# Altium footprint library Библиотека посадочных мест.PcbLib: 128 footprints (part 7 of 8)
Each footprint in its own frame and in the unit in brackets; x right, y up, seen from the top. Pads: shape width x height; smd on the part's side, far side on the other; paste and mask are expansions set on the pad; w line width, h text height; cw(c..) or ccw(c..) is an arc to the next point about the centre after c.
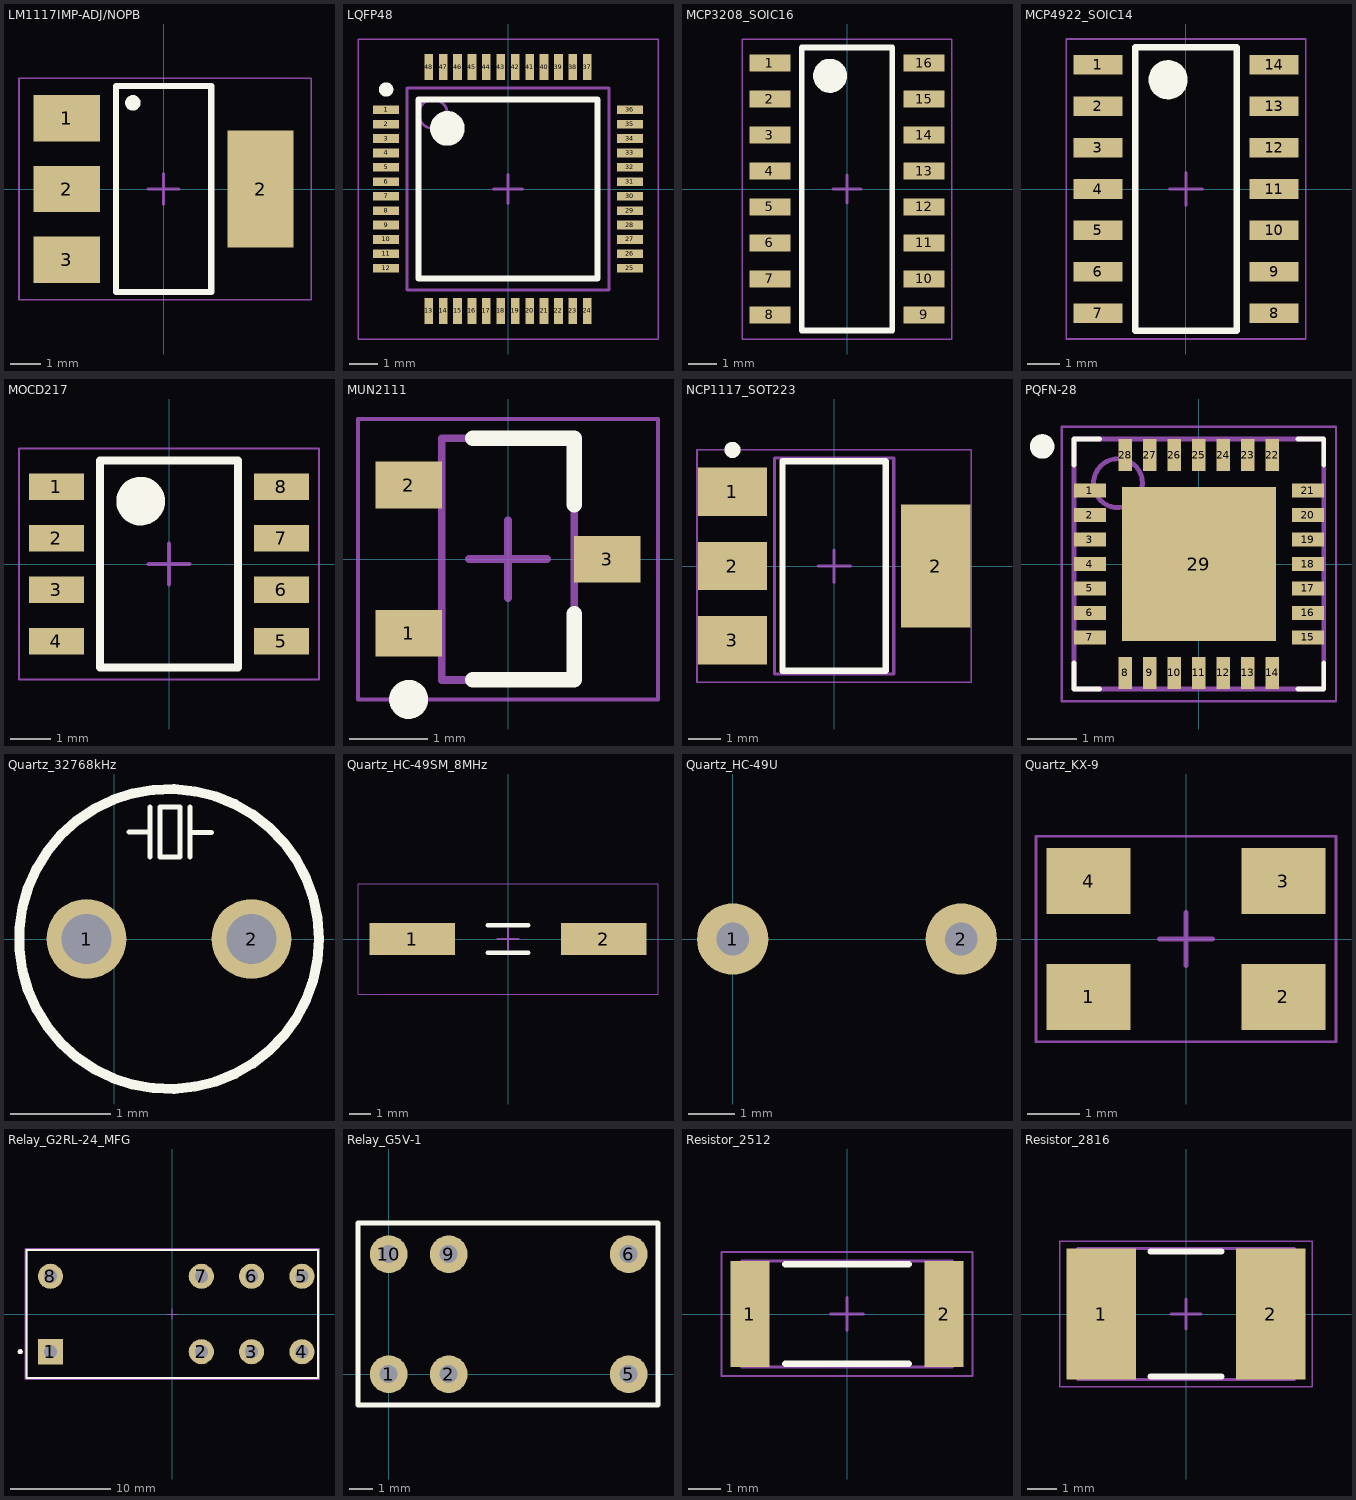
[diagram p6: the footprints below, top view; thin cyan lines are the x and y axes]

## LM1117IMP-ADJ/NOPB [mm]
height 1.8
pads (4):
  rect 2.15x1.5 smd: 1(-3.15,2.3) 2(-3.15,0) 3(-3.15,-2.3)
  rect 2.15x3.8 smd: 2(3.15,0)
Top Overlay:
  circle w0.25: c-1,2.8 r0.125
  lines w0.2: -1.55,-3.35 -1.55,3.35 1.55,3.35 1.55,-3.35 -1.55,-3.35
Mechanical 15:
  lines w0.05: -4.7,-3.6 -4.7,3.6 4.8,3.6 4.8,-3.6 -4.7,-3.6
  lines w0.1: -0.5,0 0.5,0 ; 0,-0.5 0,0.5

## LQFP48 [mm] "STM32F103C8T6"
height 1.6
pads (48):
  rect 0.9x0.3 smd: 1(-4.225,2.75) 2(-4.225,2.25) 3(-4.225,1.75) 4(-4.225,1.25) 5(-4.225,0.75) 6(-4.225,0.25) 7(-4.225,-0.25) 8(-4.225,-0.75) 9(-4.225,-1.25) 10(-4.225,-1.75) 11(-4.225,-2.25) 12(-4.225,-2.75) 25(4.225,-2.75) 26(4.225,-2.25) 27(4.225,-1.75) 28(4.225,-1.25) 29(4.225,-0.75) 30(4.225,-0.25) 31(4.225,0.25) 32(4.225,0.75) 33(4.225,1.25) 34(4.225,1.75) 35(4.225,2.25) 36(4.225,2.75)
  rect 0.3x0.9 smd: 13(-2.75,-4.225) 14(-2.25,-4.225) 15(-1.75,-4.225) 16(-1.25,-4.225) 17(-0.75,-4.225) 18(-0.25,-4.225) 19(0.25,-4.225) 20(0.75,-4.225) 21(1.25,-4.225) 22(1.75,-4.225) 23(2.25,-4.225) 24(2.75,-4.225) 37(2.75,4.225) 38(2.25,4.225) 39(1.75,4.225) 40(1.25,4.225) 41(0.75,4.225) 42(0.25,4.225) 43(-0.25,4.225) 44(-0.75,4.225) 45(-1.25,4.225) 46(-1.75,4.225) 47(-2.25,4.225) 48(-2.75,4.225)
Top Overlay:
  circle w0.6: c-2.1,2.1 r0.3
  circle w0.25: c-4.225,3.45 r0.125
  lines w0.2: -3.1,-3.1 3.1,-3.1 3.1,3.1 -3.1,3.1 -3.1,-3.1
Mechanical 13:
  circle w0.1: c-2.6,2.6 r0.5
  lines w0.1: -3.5,-3.5 3.5,-3.5 3.5,3.5 -3.5,3.5 -3.5,-3.5
Mechanical 15:
  lines w0.05: -5.2,-5.2 5.2,-5.2 5.2,5.2 -5.2,5.2 -5.2,-5.2
  lines w0.1: -0.5,0 0.5,0 ; 0,-0.5 0,0.5
3D body "LQFP48.STEP": height 1.56, standoff 0, extent -4.5,-4.513 4.5,4.487

## MCP3208_SOIC16 [mm] "SOIC, 16-Leads, Body 9,91x3,90mm, Pitch 1,27mm, IPC Medium Density"
height 1.75
pads (16):
  rect 1.45x0.6 smd: 1(-2.725,4.445) 2(-2.725,3.175) 3(-2.725,1.905) 4(-2.725,0.635) 5(-2.725,-0.635) 6(-2.725,-1.905) 7(-2.725,-3.175) 8(-2.725,-4.445) 9(2.725,-4.445) 10(2.725,-3.175) 11(2.725,-1.905) 12(2.725,-0.635) 13(2.725,0.635) 14(2.725,1.905) 15(2.725,3.175) 16(2.725,4.445)
Top Overlay:
  circle w0.6: c-0.6,4 r0.3
  lines w0.2: -1.6,-5 1.6,-5 1.6,5 -1.6,5 -1.6,-5
Mechanical 15:
  lines w0.05: -3.7,-5.3 3.7,-5.3 3.7,5.3 -3.7,5.3 -3.7,-5.3
  lines w0.1: -0.5,0 0.5,0 ; 0,-0.5 0,0.5
3D body "SOIC-16.STEP": height 1.7, standoff 0, extent -3,-5.08 3,5.08

## MCP4922_SOIC14 [mm]
height 1.75
pads (14):
  rect 1.5x0.6 smd: 1(-2.7,3.81) 2(-2.7,2.54) 3(-2.7,1.27) 4(-2.7,0) 5(-2.7,-1.27) 6(-2.7,-2.54) 7(-2.7,-3.81) 8(2.7,-3.81) 9(2.7,-2.54) 10(2.7,-1.27) 11(2.7,0) 12(2.7,1.27) 13(2.7,2.54) 14(2.7,3.81)
Top Overlay:
  circle w0.6: c-0.55,3.35 r0.3
  lines w0.2: -1.55,-4.35 -1.55,4.35 1.55,4.35 1.55,-4.35 -1.55,-4.35
Mechanical 15:
  lines w0.05: -3.675,-4.6 -3.675,4.6 3.675,4.6 3.675,-4.6 -3.675,-4.6
  lines w0.1: -0.5,0 0.5,0 ; 0,-0.5 0,0.5
3D body "SOIC-14.STEP": height 1.7, standoff 0, extent -3,-4.445 3,4.445

## MOCD217 [mm]
height 3.63
pads (8):
  rect 1.35x0.65 smd: 1(-2.775,1.905) 2(-2.775,0.635) 3(-2.775,-0.635) 4(-2.775,-1.905) 5(2.775,-1.905) 6(2.775,-0.635) 7(2.775,0.635) 8(2.775,1.905)
Top Overlay:
  circle w0.6: c-0.7,1.55 r0.3
  lines w0.2: -1.7,-2.55 1.7,-2.55 1.7,2.55 -1.7,2.55 -1.7,-2.55
Mechanical 15:
  lines w0.05: -3.7,-2.85 3.7,-2.85 3.7,2.85 -3.7,2.85 -3.7,-2.85
  lines w0.1: -0.5,0 0.5,0 ; 0,-0.5 0,0.5
3D body "SOIC_D207M_ONS.step": height 3.66, standoff 0, extent -3.099,-2.565 3.099,2.565

## MUN2111 [mm] "SOT23"
height 1.3
pads (3):
  rect 0.85x0.6 smd: 1(-1.275,-0.95) 2(-1.275,0.95) 3(1.275,0)
Top Overlay:
  circle w0.25: c-1.275,-1.8 r0.125
  lines w0.2: -0.45,-1.55 0.85,-1.55 0.85,-0.7 ; -0.45,1.55 0.85,1.55 0.85,0.7
Mechanical 13:
  lines w0.1: -0.85,-1.55 -0.85,1.55 0.85,1.55 0.85,-1.55 -0.85,-1.55
Mechanical 15:
  lines w0.05: -1.925,-1.8 -1.925,1.8 1.925,1.8 1.925,-1.8 -1.925,-1.8
  lines w0.1: -0.5,0 0.5,0 ; 0,-0.5 0,0.5
3D body "MUN2111.step": height 1.3, standoff 0, extent -1.2,-1.55 1.2,1.55

## NCP1117_SOT223 [mm]
height 1.8
pads (4):
  rect 2.15x1.5 smd: 1(-3.15,2.3) 2(-3.15,0) 3(-3.15,-2.3)
  rect 2.15x3.8 smd: 2(3.15,0)
Top Overlay:
  circle w0.25: c-3.15,3.6 r0.125
  lines w0.2: -1.6,-3.25 1.6,-3.25 1.6,3.25 -1.6,3.25 -1.6,-3.25
Mechanical 13:
  lines w0.1: -1.85,-3.35 1.85,-3.35 1.85,3.35 -1.85,3.35 -1.85,-3.35
Mechanical 15:
  lines w0.05: -4.25,-3.6 4.25,-3.6 4.25,3.6 -4.25,3.6 -4.25,-3.6
  lines w0.1: -0.5,0 0.5,0 ; 0,-0.5 0,0.5
3D body "SOT223127P600-8N.step": height 1.8, standoff 0, extent -3.65,-3.35 3.65,3.35

## PQFN-28 [mm] "For ADE7953, pack LFCSP-WQ"
height 0.8
pads (29):
  rect 0.65x0.28 smd: 1(-2.225,1.5) 2(-2.225,1) 3(-2.225,0.5) 4(-2.225,0) 5(-2.225,-0.5) 6(-2.225,-1) 7(-2.225,-1.5) 15(2.225,-1.5) 16(2.225,-1) 17(2.225,-0.5) 18(2.225,0) 19(2.225,0.5) 20(2.225,1) 21(2.225,1.5)
  rect 0.28x0.65 smd: 8(-1.5,-2.225) 9(-1,-2.225) 10(-0.5,-2.225) 11(0,-2.225) 12(0.5,-2.225) 13(1,-2.225) 14(1.5,-2.225) 22(1.5,2.225) 23(1,2.225) 24(0.5,2.225) 25(0,2.225) 26(-0.5,2.225) 27(-1,2.225) 28(-1.5,2.225)
  rect 3.14x3.14 smd: 29(0,0)
Top Overlay:
  circle w0.25: c-3.2,2.4 r0.125
  lines w0.1: -2.55,-2.025 -2.55,-2.55 -2.025,-2.55 ; -2.55,2.025 -2.55,2.55 -2.025,2.55 ; 2.025,-2.55 2.55,-2.55 2.55,-2.025 ; 2.025,2.55 2.55,2.55 2.55,2.025
Mechanical 13:
  circle w0.1: c-1.65,1.65 r0.5
  lines w0.1: -2.55,-2.55 2.55,-2.55 2.55,2.55 -2.55,2.55 -2.55,-2.55
Mechanical 15:
  lines w0.05: -2.8,-2.8 2.8,-2.8 2.8,2.8 -2.8,2.8 -2.8,-2.8
  lines w0.1: -0.5,0 0.5,0 ; 0,-0.5 0,0.5
3D body: height 0.8, standoff 0.02, extent -2.55,-2.55 2.55,2.55

## Quartz_32768kHz [mm]
pads (2):
  round 0.8 hole 0.5: 1(-0.275,0) 2(1.375,0)
Top Overlay:
  circle w0.1: c0.55,0 r1.5
  lines w0.05: 0.151,1.068 0.362,1.068 ; 0.362,0.818 0.362,1.318 ; 0.762,0.818 0.762,1.318 ; 0.762,1.067 0.973,1.067 ; 0.462,0.818 0.462,1.318 0.662,1.318 0.662,0.818 0.462,0.818
3D body "DT-38T_32768.STEP": height 3, standoff -2.5, extent -0.95,-10.9 2.05,0.15

## Quartz_HC-49SM_8MHz [mm]
height 5
pads (2):
  rect 4x1.5 smd: 1(-4.5,0) 2(4.5,0)
Top Overlay:
  lines w0.2: -0.95,-0.65 0.95,-0.65 ; -0.95,0.65 0.95,0.65
Mechanical 15:
  lines w0.05: -7.05,-2.6 7.05,-2.6 7.05,2.6 -7.05,2.6 -7.05,-2.6
  lines w0.1: -0.5,0 0.5,0 ; 0,-0.5 0,0.5

## Quartz_HC-49U [mil] "DFN, 4-Leads, Body 3,20x5,00mm, Pitch 3,70mm, IPC Medium Density"
height 39.37
pads (2):
  round 60 hole 27.56: 1(0,0) 2(192.13,0)
3D body "HC-49U.STEP": height 208.66, standoff -78.74, extent -169.68,-681.11 361.81,11.81

## Quartz_KX-9 [mm] "DFN, 4-Leads, Body 3,20x5,00mm, Pitch 3,70mm, IPC Medium Density"
height 1
pads (4):
  rect 1.6x1.25 smd: 1(-1.85,-1.1) 2(1.85,-1.1) 3(1.85,1.1) 4(-1.85,1.1)
Mechanical 15:
  lines w0.05: -2.85,-1.95 2.85,-1.95 2.85,1.95 -2.85,1.95 -2.85,-1.95
  lines w0.1: -0.5,0 0.5,0 ; 0,-0.5 0,0.5
3D body "User Library-GeyerElectronics_KX9A.STEP": height 1.01, standoff 0, extent -2.5,-1.6 2.5,1.6

## Relay_G2RL-24_MFG [mm] "Omron"
pads (8):
  rect 2.5x2.5 hole 1.3 paste-1000 mask+0: 1(-12.1,-3.75)
  round 2.5 hole 1.3 paste-1000 mask+0: 2(2.9,-3.75) 3(7.9,-3.75) 4(12.9,-3.75) 5(12.9,3.75) 6(7.9,3.75) 7(2.9,3.75) 8(-12.1,3.75)
Top Overlay:
  circle w0.25: c-15.1,-3.75 r0.125
  lines w0.2: -14.5,-6.35 14.5,-6.35 14.5,6.35 -14.5,6.35 -14.5,-6.35
Mechanical 10:
  lines w0.2: -14.6,-6.45 14.6,-6.45 14.6,6.45 -14.6,6.45 -14.6,-6.45
  text ".Designator" at 0,0 h1
Mechanical 12:
  lines w0.2: -14.5,-6.35 14.5,-6.35 14.5,6.35 -14.5,6.35 -14.5,-6.35
Mechanical 15:
  lines w0.1: -0.5,0 0.5,0 ; 0,-0.5 0,0.5
  lines w0.2: -14.6,-6.45 14.6,-6.45 14.6,6.45 -14.6,6.45 -14.6,-6.45
3D body "Relay_Omron_G2RL-24-DC24_eec.STEP": height 15.71, standoff -3.5, extent -14.5,-6.35 14.5,6.35

## Relay_G5V-1 [mm]
pads (6):
  round 1.6 hole 0.762: 1(0,0) 2(2.54,0) 5(10.16,0) 6(10.16,5.08) 9(2.54,5.08) 10(0,5.08)
Top Overlay:
  lines w0.2: -1.3,-1.3 -1.3,6.4 11.4,6.4 11.4,-1.3 -1.3,-1.3
3D body "User Library-G5V-1-1.STEP": height 10, standoff -3.5, extent -1.067,-1.11 11.233,6.19

## Resistor_2512 [mm] "RC series"
height 0.55
pads (2):
  rect 1.2x3.25 smd: 1(-2.975,0) 2(2.975,0)
Top Overlay:
  lines w0.2: -1.9,-1.525 1.9,-1.525 ; -1.9,1.525 1.9,1.525
Mechanical 13:
  lines w0.1: -3.225,-1.625 3.225,-1.625 3.225,1.625 -3.225,1.625 -3.225,-1.625
Mechanical 15:
  lines w0.05: -3.85,-1.9 3.85,-1.9 3.85,1.9 -3.85,1.9 -3.85,-1.9
  lines w0.1: -0.5,0 0.5,0 ; 0,-0.5 0,0.5
3D body: height 0.55, standoff 0, extent 2.725,-1.625 3.225,1.625
3D body: height 0.55, standoff 0, extent -3.225,-1.625 -2.725,1.625
3D body: height 0.55, standoff 0, extent -2.725,-1.625 2.725,1.625

## Resistor_2816 [mm] "VISHAY, 2W"
pads (2):
  rect 2.35x4.4 smd: 1(-2.85,0) 2(2.85,0)
Top Overlay:
  lines w0.2: -1.2,-2.1 1.2,-2.1 ; -1.2,2.1 1.2,2.1
Mechanical 13:
  lines w0.1: -3.65,-2.2 3.65,-2.2 3.65,2.2 -3.65,2.2 -3.65,-2.2
Mechanical 15:
  lines w0.05: -4.25,-2.45 4.25,-2.45 4.25,2.45 -4.25,2.45 -4.25,-2.45
  lines w0.1: -0.5,0 0.5,0 ; 0,-0.5 0,0.5
3D body "WSL2816 (0.002 to 0.00399).STEP": height 0.66, standoff 0, extent -3.55,-2.1 3.55,2.1